# Altium footprint library PR_COR.PcbLib: 73 footprints (part 5 of 5)
Each footprint in its own frame and in the unit in brackets; x right, y up, seen from the top. Pads: shape width x height; smd on the part's side, far side on the other; paste and mask are expansions set on the pad; w line width, h text height; cw(c..) or ccw(c..) is an arc to the next point about the centre after c.
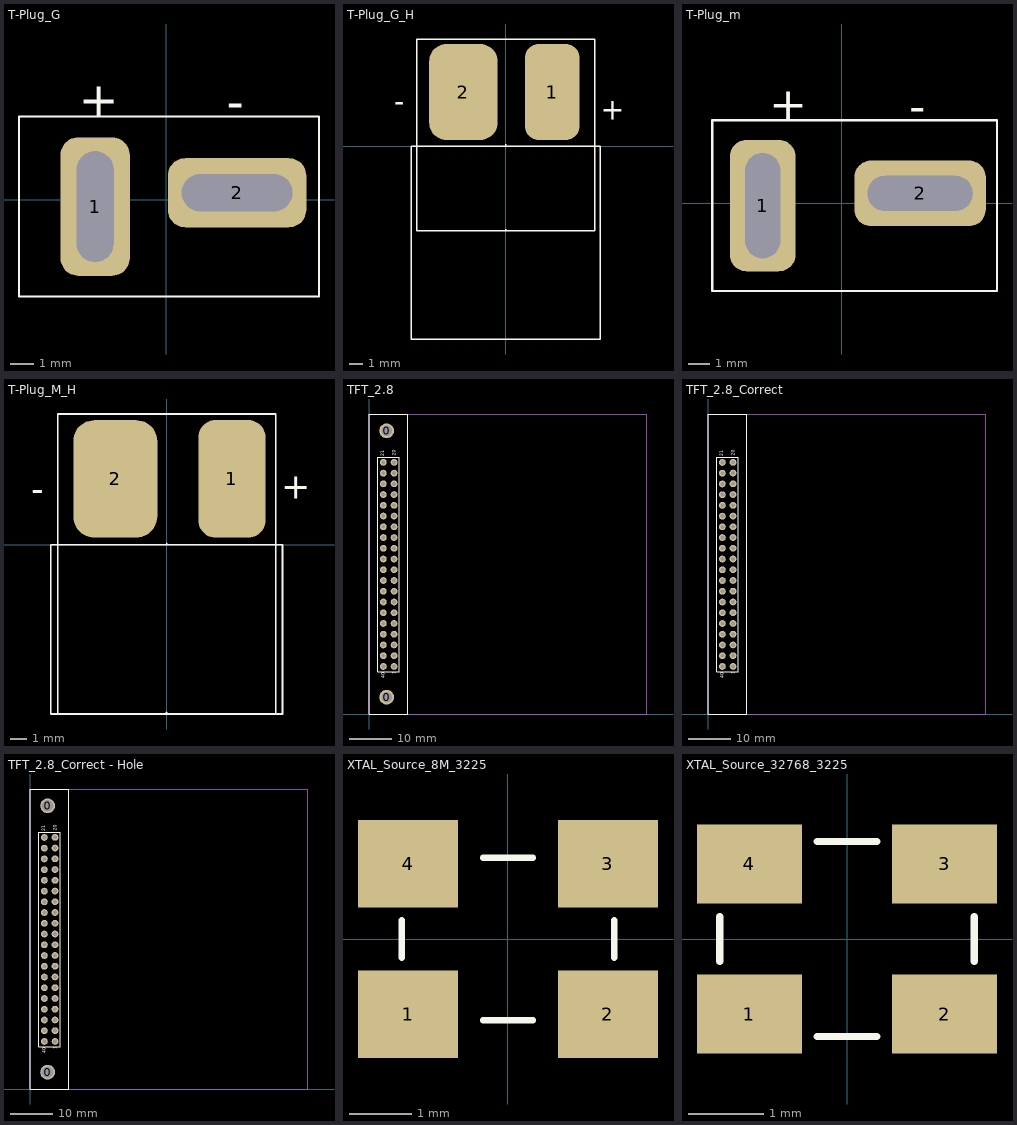
[diagram p4: the footprints below, top view; thin cyan lines are the x and y axes]

## T-Plug_G [mm]
pads (2):
  rrect50% 3x6 hole 1.6 slot 4.8 at 90 deg: 1(-3.075,-0.3)
  rrect50% 6x3 hole 1.6 slot 4.8 at 0 deg: 2(3.075,0.3)
Top Overlay:
  lines w0.1: -6.375,-4.2 6.625,-4.2 6.625,3.6 -6.375,3.6 -6.375,-4.2
  text "+" at -3.775,3.6 h1.52
  text "-" at 2.625,3.5 h1.52
3D body: height 14.02, standoff -4.98, extent -6.375,-4.2 6.625,3.6

## T-Plug_G_H [mm]
pads (2):
  rrect50% 4x7 smd: 1(3.388,3.938)
  rrect50% 5x7 smd: 2(-3.088,3.938)
Top Overlay:
  lines w0.1: 0,-6.163 0,-6.05 ; 0,0 0,0.125 ; -6.5,0 -6.5,-6.163 6.5,-6.163 6.5,0 ; -6.5,0 -6.5,7.8 6.5,7.8 6.5,0 ; -6.5,0 6.5,0 ; -6.5,0 -6.9,0 -6.9,-14.063 6.9,-14.063 6.9,0 6.5,0
  text "-" at -8.138,2.537 h1.52
  text "+" at 6.937,1.912 h1.52
3D body: height 5.67, standoff -2.13, extent -6.5,-14.063 6.5,4.938

## T-Plug_m [mm]
pads (2):
  rrect50% 3x6 hole 1.6 slot 4.8 at 90 deg: 1(-3.612,-0.112)
  rrect50% 6x3 hole 1.6 slot 4.8 at 0 deg: 2(3.575,0.45)
Top Overlay:
  lines w0.1: -5.912,-4.012 7.088,-4.012 7.088,3.788 -5.912,3.788 -5.912,-4.012
  text "+" at -3.312,3.788 h1.52
  text "-" at 3.088,3.688 h1.52
3D body: height 10.02, standoff -4.98, extent -5.912,-4.012 7.088,3.787

## T-Plug_M_H [mm]
pads (2):
  rrect50% 4x7 smd: 1(3.888,3.938)
  rrect50% 5x7 smd: 2(-3.063,3.938)
Top Overlay:
  lines w0.1: -0.013,-10.075 -0.013,-9.963 ; 0,0 0,0.1 ; 6.5,-10.075 6.9,-10.075 6.9,0 6.5,0 ; -6.9,-10.075 -6.5,-10.075 ; -6.9,-10.075 -6.9,-10.075 ; -6.9,-10.075 -6.9,0 -6.5,0 ; -6.5,-10.075 -6.5,0 ; -6.5,-10.075 6.475,-10.075 6.5,-10.05 6.5,0 ; -6.5,0 6.5,0 ; -6.5,0 -6.5,7.8 6.5,7.8 6.5,0
  text "+" at 6.812,2.737 h1.52
  text "-" at -8.063,2.587 h1.52
3D body: height 5.67, standoff -2.13, extent -6.513,-10.075 6.487,4.925

## TFT_2.8 [mm] "Connector; Header; 20x2 Position"
pads (42):
  round 3.5 hole 2.5: 0(4.14,3.98) 0(4.14,66.97)
  round 1.6 hole 0.9: 1(5.9,11.25) 2(5.9,13.79) 3(5.9,16.33) 4(5.9,18.87) 5(5.9,21.41) 6(5.9,23.95) 7(5.9,26.49) 8(5.9,29.03) 9(5.9,31.57) 10(5.9,34.11) 11(5.9,36.65) 12(5.9,39.19) 13(5.9,41.73) 14(5.9,44.27) 15(5.9,46.81) 16(5.9,49.35) 17(5.9,51.89) 18(5.9,54.43) 19(5.9,56.97) 20(5.9,59.51) 21(3.36,59.51) 22(3.36,56.97) 23(3.36,54.43) 24(3.36,51.89) 25(3.36,49.35) 26(3.36,46.81) 27(3.36,44.27) 28(3.36,41.73) 29(3.36,39.19) 30(3.36,36.65) 31(3.36,34.11) 32(3.36,31.57) 33(3.36,29.03) 34(3.36,26.49) 35(3.36,23.95) 36(3.36,21.41) 37(3.36,18.87) 38(3.36,16.33) 39(3.36,13.79) 40(3.37,11.24)
Top Overlay:
  lines w0.127: 0,0 0,70.95 9.19,70.95 9.19,0 0,0
  lines w0.2: 2.09,9.98 2.09,60.78 7.17,60.78 7.17,9.98 2.09,9.98
  text "1" at 6.27,9.37 h0.76
  text "40" at 3.64,8.43 h0.76
  text "21" at 3.58,60.99 h0.76
  text "20" at 6.25,61.05 h0.76
Mechanical 2:
  lines w0.1: 0,0 65.69,0 65.69,70.95 0,70.95 0,0

## TFT_2.8_Correct [mm] "Connector; Header; 20x2 Position"
pads (40):
  round 1.6 hole 0.9: 1(3.37,11.24) 2(3.37,13.78) 3(3.37,16.32) 4(3.37,18.86) 5(3.37,21.4) 6(3.37,23.94) 7(3.37,26.48) 8(3.37,29.02) 9(3.37,31.56) 10(3.37,34.1) 11(3.37,36.64) 12(3.37,39.18) 13(3.37,41.72) 14(3.37,44.26) 15(3.37,46.8) 16(3.37,49.34) 17(3.37,51.88) 18(3.37,54.42) 19(3.37,56.96) 20(3.37,59.5) 21(5.89,59.52) 22(5.89,56.98) 23(5.89,54.44) 24(5.89,51.9) 25(5.89,49.36) 26(5.89,46.82) 27(5.89,44.28) 28(5.89,41.74) 29(5.89,39.2) 30(5.89,36.66) 31(5.89,34.12) 32(5.89,31.58) 33(5.89,29.04) 34(5.89,26.5) 35(5.89,23.96) 36(5.89,21.42) 37(5.89,18.88) 38(5.89,16.34) 39(5.89,13.8) 40(5.9,11.25)
Top Overlay:
  lines w0.127: 0,0 9.19,0 9.19,70.95 0,70.95 0,0
  lines w0.2: 2.09,9.98 7.17,9.98 7.17,60.78 2.09,60.78 2.09,9.98
  text "20" at 6.25,61.05 h0.76
  text "21" at 3.58,60.99 h0.76
  text "40" at 3.64,8.43 h0.76
  text "1" at 6.27,9.37 h0.76
Mechanical 2:
  lines w0.1: 0,0 0,70.95 65.69,70.95 65.69,0 0,0

## TFT_2.8_Correct - Hole [mm] "Connector; Header; 20x2 Position"
pads (42):
  round 3.5 hole 2.8: 0(4.14,3.98) 0(4.14,66.97)
  round 1.6 hole 0.9: 1(3.37,11.24) 2(3.37,13.78) 3(3.37,16.32) 4(3.37,18.86) 5(3.37,21.4) 6(3.37,23.94) 7(3.37,26.48) 8(3.37,29.02) 9(3.37,31.56) 10(3.37,34.1) 11(3.37,36.64) 12(3.37,39.18) 13(3.37,41.72) 14(3.37,44.26) 15(3.37,46.8) 16(3.37,49.34) 17(3.37,51.88) 18(3.37,54.42) 19(3.37,56.96) 20(3.37,59.5) 21(5.89,59.52) 22(5.89,56.98) 23(5.89,54.44) 24(5.89,51.9) 25(5.89,49.36) 26(5.89,46.82) 27(5.89,44.28) 28(5.89,41.74) 29(5.89,39.2) 30(5.89,36.66) 31(5.89,34.12) 32(5.89,31.58) 33(5.89,29.04) 34(5.89,26.5) 35(5.89,23.96) 36(5.89,21.42) 37(5.89,18.88) 38(5.89,16.34) 39(5.89,13.8) 40(5.9,11.25)
Top Overlay:
  lines w0.127: 0,0 9.19,0 9.19,70.95 0,70.95 0,0
  lines w0.2: 2.09,9.98 7.17,9.98 7.17,60.78 2.09,60.78 2.09,9.98
  text "20" at 6.25,61.05 h0.76
  text "21" at 3.58,60.99 h0.76
  text "40" at 3.64,8.43 h0.76
  text "1" at 6.27,9.37 h0.76
Mechanical 2:
  lines w0.1: 0,0 0,70.95 65.69,70.95 65.69,0 0,0

## XTAL_Source_8M_3225 [mm]
pads (4):
  rect 1.6x1.4 smd: 1(-1.6,-1.2) 2(1.6,-1.2) 3(1.6,1.2) 4(-1.6,1.2)
Top Overlay:
  lines w0.1: -1.7,-0.3 -1.7,0.3 ; -0.4,-1.3 0.4,-1.3 ; -0.4,1.3 0.4,1.3 ; 1.7,-0.3 1.7,0.3
3D body: height 0.98, standoff 0.02, extent -1.6,-1.25 1.6,1.25

## XTAL_Source_32768_3225 [mm]
pads (4):
  rect 1.4x1.05 smd: 1(-1.3,-1) 2(1.3,-1) 3(1.3,1) 4(-1.3,1)
Top Overlay:
  lines w0.1: -1.7,-0.3 -1.7,0.3 ; -0.4,-1.3 0.4,-1.3 ; -0.4,1.3 0.4,1.3 ; 1.7,-0.3 1.7,0.3
3D body: height 0.98, standoff 0.02, extent -1.6,-1.25 1.6,1.25